# Altium footprint library General.PcbLib: 446 footprints (part 24 of 28)
Each footprint in its own frame and in the unit in brackets; x right, y up, seen from the top. Pads: shape width x height; smd on the part's side, far side on the other; paste and mask are expansions set on the pad; w line width, h text height; cw(c..) or ccw(c..) is an arc to the next point about the centre after c.
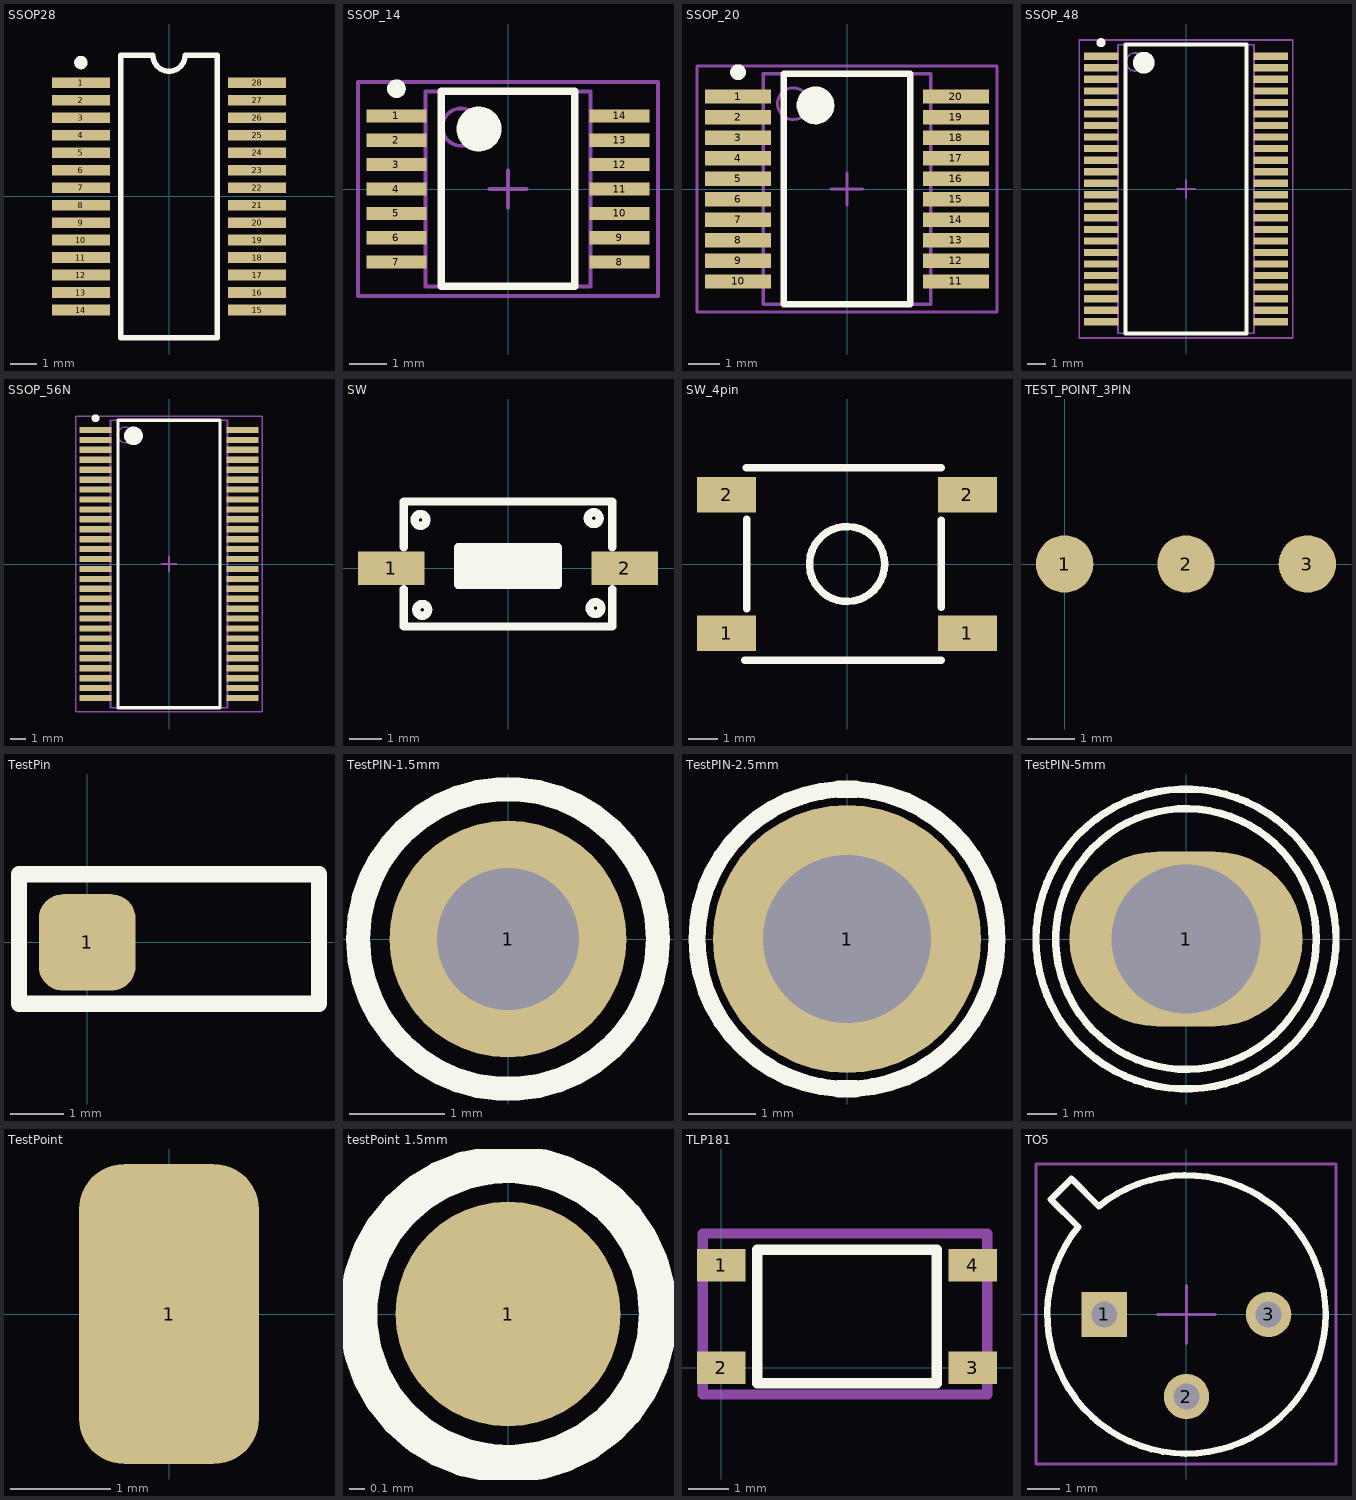
[diagram p23: the footprints below, top view; thin cyan lines are the x and y axes]

## SSOP28 [mm]
pads (28):
  rect 2.15x0.4 smd: 1(-3.275,4.225) 2(-3.275,3.575) 3(-3.275,2.925) 4(-3.275,2.275) 5(-3.275,1.625) 6(-3.275,0.975) 7(-3.275,0.325) 8(-3.275,-0.325) 9(-3.275,-0.975) 10(-3.275,-1.625) 11(-3.275,-2.275) 12(-3.275,-2.925) 13(-3.275,-3.575) 14(-3.275,-4.225) 15(3.275,-4.225) 16(3.275,-3.575) 17(3.275,-2.925) 18(3.275,-2.275) 19(3.275,-1.625) 20(3.275,-0.975) 21(3.275,-0.325) 22(3.275,0.325) 23(3.275,0.975) 24(3.275,1.625) 25(3.275,2.275) 26(3.275,2.925) 27(3.275,3.575) 28(3.275,4.225)
Top Overlay:
  circle w0.25: c-3.275,4.975 r0.125
  lines w0.2: -1.8,-5.25 -1.8,5.25 -0.6,5.25 ccw(c0,5.25) 0.6,5.25 1.8,5.25 1.8,-5.25 -1.8,-5.25

## SSOP_14 [mm] "SSOP, 14-Leads, Body 5.2x4.4mm (max), Pitch 0.65mm, IPC Medium Density"
height 1.2
pads (14):
  rect 1.6x0.35 smd: 1(-2.975,1.95) 2(-2.975,1.3) 3(-2.975,0.65) 4(-2.975,0) 5(-2.975,-0.65) 6(-2.975,-1.3) 7(-2.975,-1.95) 8(2.975,-1.95) 9(2.975,-1.3) 10(2.975,-0.65) 11(2.975,0) 12(2.975,0.65) 13(2.975,1.3) 14(2.975,1.95)
Top Overlay:
  circle w0.25: c-2.975,2.675 r0.125
  circle w0.6: c-0.775,1.6 r0.3
  lines w0.2: -1.775,-2.6 -1.775,2.6 1.775,2.6 1.775,-2.6 -1.775,-2.6
Mechanical 13:
  circle w0.1: c-1.25,1.65 r0.5
  lines w0.1: -2.2,-2.6 -2.2,2.6 2.2,2.6 2.2,-2.6 -2.2,-2.6
Mechanical 15:
  lines w0.1: -0.5,0 0.5,0 ; 0,-0.5 0,0.5 ; -4,-2.85 -4,2.85 4,2.85 4,-2.85 -4,-2.85
3D body: height 1.2, standoff 0.1, extent -2.2,-2.6 2.2,2.6

## SSOP_20 [mm] "SOP, 20-Leads, Body 7.3x5.3mm (max), Pitch 0.65mm, IPC Medium Density"
height 2
pads (20):
  rect 2.1x0.45 smd: 1(-3.45,2.925) 2(-3.45,2.275) 3(-3.45,1.625) 4(-3.45,0.975) 5(-3.45,0.325) 6(-3.45,-0.325) 7(-3.45,-0.975) 8(-3.45,-1.625) 9(-3.45,-2.275) 10(-3.45,-2.925) 11(3.45,-2.925) 12(3.45,-2.275) 13(3.45,-1.625) 14(3.45,-0.975) 15(3.45,-0.325) 16(3.45,0.325) 17(3.45,0.975) 18(3.45,1.625) 19(3.45,2.275) 20(3.45,2.925)
Top Overlay:
  circle w0.25: c-3.45,3.7 r0.125
  circle w0.6: c-1,2.65 r0.3
  lines w0.2: -2,-3.65 -2,3.65 2,3.65 2,-3.65 -2,-3.65
Mechanical 13:
  circle w0.1: c-1.7,2.7 r0.5
  lines w0.1: -2.65,-3.65 -2.65,3.65 2.65,3.65 2.65,-3.65 -2.65,-3.65
Mechanical 15:
  lines w0.1: -0.5,0 0.5,0 ; 0,-0.5 0,0.5 ; -4.75,-3.9 -4.75,3.9 4.75,3.9 4.75,-3.9 -4.75,-3.9
3D body "User Library-TSSOP-20-1.STEP": height 1, standoff 0, extent -3.23,-3.251 3.179,3.249

## SSOP_48 [mm] "SSOP, 48-Leads, Body 15.9x7.5mm (max), Pitch 0.63mm, IPC Medium Density"
height 2.54
pads (48):
  rect 1.9x0.4 smd: 1(-4.675,7.302) 2(-4.675,6.667) 3(-4.675,6.032) 4(-4.675,5.397) 5(-4.675,4.763) 6(-4.675,4.127) 7(-4.675,3.492) 8(-4.675,2.857) 9(-4.675,2.222) 10(-4.675,1.587) 11(-4.675,0.953) 12(-4.675,0.318) 13(-4.675,-0.318) 14(-4.675,-0.953) 15(-4.675,-1.587) 16(-4.675,-2.222) 17(-4.675,-2.857) 18(-4.675,-3.492) 19(-4.675,-4.127) 20(-4.675,-4.763) 21(-4.675,-5.397) 22(-4.675,-6.032) 23(-4.675,-6.667) 24(-4.675,-7.302) 25(4.675,-7.302) 26(4.675,-6.667) 27(4.675,-6.032) 28(4.675,-5.397) 29(4.675,-4.763) 30(4.675,-4.127) 31(4.675,-3.492) 32(4.675,-2.857) 33(4.675,-2.222) 34(4.675,-1.587) 35(4.675,-0.953) 36(4.675,-0.318) 37(4.675,0.318) 38(4.675,0.953) 39(4.675,1.587) 40(4.675,2.222) 41(4.675,2.857) 42(4.675,3.492) 43(4.675,4.127) 44(4.675,4.763) 45(4.675,5.397) 46(4.675,6.032) 47(4.675,6.667) 48(4.675,7.302)
Top Overlay:
  circle w0.25: c-4.675,8.053 r0.125
  circle w0.6: c-2.325,6.95 r0.3
  lines w0.2: -3.325,-7.95 -3.325,7.95 3.325,7.95 3.325,-7.95 -3.325,-7.95
Mechanical 13:
  circle w0.1: c-2.795,6.99 r0.5
  lines w0.1: -3.745,-7.94 -3.745,7.94 3.745,7.94 3.745,-7.94 -3.745,-7.94
Mechanical 15:
  lines w0.1: -0.5,0 0.5,0 ; 0,-0.5 0,0.5 ; -5.875,-8.2 -5.875,8.2 5.875,8.2 5.875,-8.2 -5.875,-8.2
3D body: height 2.54, standoff 0.3, extent -3.745,-7.94 3.745,7.94

## SSOP_56N [mm] "SSOP, 56-Leads, Body 18.4x7.5mm (max), Pitch 0.63mm, IPC Medium Density"
height 2.54
pads (56):
  rect 2.05x0.4 smd: 1(-4.7,8.572) 2(-4.7,7.938) 3(-4.7,7.302) 4(-4.7,6.667) 5(-4.7,6.032) 6(-4.7,5.397) 7(-4.7,4.763) 8(-4.7,4.127) 9(-4.7,3.492) 10(-4.7,2.857) 11(-4.7,2.222) 12(-4.7,1.587) 13(-4.7,0.953) 14(-4.7,0.318) 15(-4.7,-0.318) 16(-4.7,-0.953) 17(-4.7,-1.587) 18(-4.7,-2.222) 19(-4.7,-2.857) 20(-4.7,-3.492) 21(-4.7,-4.127) 22(-4.7,-4.763) 23(-4.7,-5.397) 24(-4.7,-6.032) 25(-4.7,-6.667) 26(-4.7,-7.302) 27(-4.7,-7.938) 28(-4.7,-8.572) 29(4.7,-8.572) 30(4.7,-7.938) 31(4.7,-7.302) 32(4.7,-6.667) 33(4.7,-6.032) 34(4.7,-5.397) 35(4.7,-4.763) 36(4.7,-4.127) 37(4.7,-3.492) 38(4.7,-2.857) 39(4.7,-2.222) 40(4.7,-1.587) 41(4.7,-0.953) 42(4.7,-0.318) 43(4.7,0.318) 44(4.7,0.953) 45(4.7,1.587) 46(4.7,2.222) 47(4.7,2.857) 48(4.7,3.492) 49(4.7,4.127) 50(4.7,4.763) 51(4.7,5.397) 52(4.7,6.032) 53(4.7,6.667) 54(4.7,7.302) 55(4.7,7.938) 56(4.7,8.572)
Top Overlay:
  circle w0.25: c-4.7,9.323 r0.125
  circle w0.6: c-2.275,8.2 r0.3
  lines w0.2: -3.275,-9.2 -3.275,9.2 3.275,9.2 3.275,-9.2 -3.275,-9.2
Mechanical 13:
  circle w0.1: c-2.795,8.26 r0.5
  lines w0.1: -3.745,-9.21 -3.745,9.21 3.745,9.21 3.745,-9.21 -3.745,-9.21
Mechanical 15:
  lines w0.1: -0.5,0 0.5,0 ; 0,-0.5 0,0.5 ; -5.975,-9.45 -5.975,9.45 5.975,9.45 5.975,-9.45 -5.975,-9.45
3D body: height 2.54, standoff 0.3, extent -3.745,-9.21 3.745,9.21

## SW [mil]
height 62.99
pads (2):
  rect 80x40 smd: 1(-140,0) 2(140,0)
Top Overlay:
  circle w10: c102.93,60 r7.07
  circle w10: c-105,57.93 r7.07
  circle w10: c-102.93,-50 r7.07
  circle w10: c105,-47.93 r7.07
  rectangle: -60,-20 60,25
  lines w10: -125,-25 -125,-70 125,-70 125,-25 ; -125,25 -125,80 125,80 125,25 ; -60,-20 -60,25 60,25 60,-20 -60,-20
3D body "Switch.STEP": height 75.41, standoff 0.6, extent -168.19,-69.06 168.2,79.36

## SW_4pin [mm]
pads (4):
  rect 2x1.2 smd: 1(-4.077,-2.349) 1(4.077,-2.349) 2(-4.077,2.349) 2(4.077,2.349)
Top Overlay:
  circle w0.254: c0,0 r1.27
  lines w0.254: -3.467,-3.264 3.188,-3.264 ; -3.416,3.264 3.188,3.264 ; -3.391,-1.511 -3.391,1.511 ; 3.188,-1.46 3.188,1.486
3D body "KFC-A06-HA-4_3.STEP": height 4.3, standoff 0, extent -4.551,-2.977 4.449,3.023

## TEST_POINT_3PIN [mm]
pads (3):
  round 1.2 smd: 1(0,0) 2(2.54,0) 3(5.08,0)

## TestPin [mm]
pads (1):
  rrect50% 1.8x1.8 smd: 1(0,0)
Top Overlay:
  lines w0.305: -1.27,-1.143 -1.27,1.27 4.318,1.27 4.318,-1.143 -1.27,-1.143
  text ".Comment" at 1.27,-0.254 h0.76

## TestPIN-1.5mm [mm]
pads (1):
  round 2.5 hole 1.5: 1(0,0)
Top Overlay:
  circle w0.254: c0,0 r1.581

## TestPIN-2.5mm [mm]
pads (1):
  round 4 hole 2.5: 1(0,0)
Top Overlay:
  circle w0.254: c0,0 r2.236

## TestPIN-5mm [mm]
pads (1):
  oval 8x6 hole 5.1 unplated: 1(0,0)
Top Overlay:
  circle w0.254: c0,0 r4.472
  circle w0.254: c0,0 r5.148

## TestPoint [mm]
pads (1):
  rrect50% 1.8x3 smd: 1(0,0)

## testPoint 1.5mm [mm]
pads (1):
  round 1.5 smd: 1(0,0)
Top Overlay:
  circle w0.254: c0,0 r1

## TLP181 [mm]
pads (4):
  rect 1.2x0.8 smd: 1(0,2.54) 2(0,0) 3(6.223,0) 4(6.223,2.54)
Top Overlay:
  lines w0.254: 0.889,-0.381 5.334,-0.381 5.334,2.921 0.889,2.921 0.889,-0.381
Mechanical 15:
  lines w0.254: -0.457,-0.66 -0.457,3.327 6.579,3.327 6.579,-0.66 -0.457,-0.66
3D body "User Library-PS2701_optocoupler.step": height 1.89, standoff -0.02, extent -0.427,-0.704 6.573,3.296

## TO5 [mm] "Can; 3 Leads; Pin Circle Dia. 5.08 mm; Lead Dia. 0.48 mm (max)"
height 4.7
pads (3):
  rect 1.4x1.4 hole 0.8: 1(-2.54,0)
  round 1.4 hole 0.8: 2(0,-2.54) 3(2.54,0)
Top Overlay:
  lines w0.2: -4.191,3.554 -3.342,2.706 ccw(c0,0) -2.706,3.342 -3.554,4.19 -4.19,3.554
Mechanical 13:
  lines w0.1: -4.216,3.556 -3.378,2.718 ccw(c0,0) -2.733,3.366 -3.581,4.191 -4.216,3.556
Mechanical 15:
  lines w0.1: -0.889,0 0.889,0 ; 0,-0.889 0,0.889 ; -4.648,-4.623 -4.648,4.648 4.623,4.648 4.623,-4.623 -4.648,-4.623
3D body: height 4.7, standoff 0, extent -4.301,-4.311 4.301,4.306